# Altium footprint library SOT23-5.PcbLib: 1 footprints
Each footprint in its own frame and in the unit in brackets; x right, y up, seen from the top. Pads: shape width x height; smd on the part's side, far side on the other; paste and mask are expansions set on the pad; w line width, h text height; cw(c..) or ccw(c..) is an arc to the next point about the centre after c.
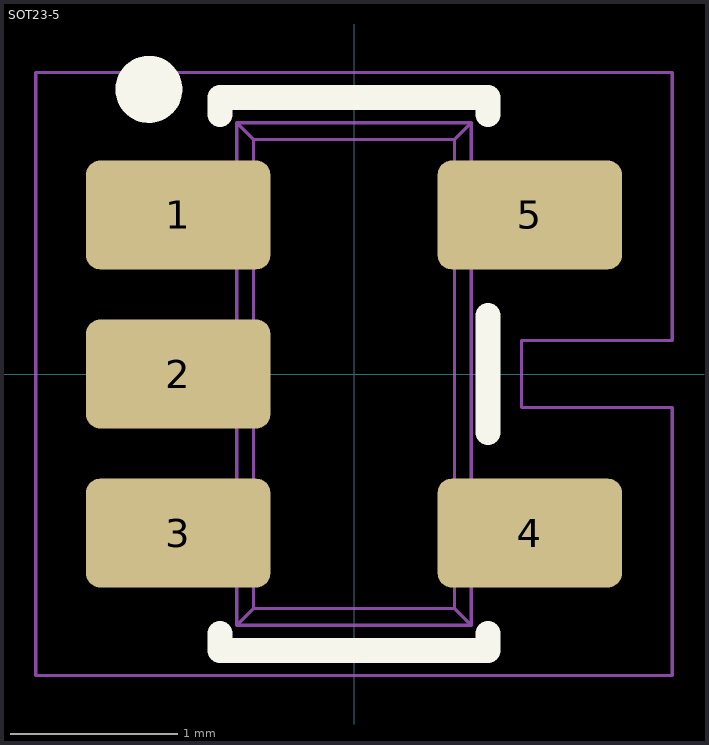
[diagram p0: the footprint, top view; thin cyan lines are the x and y axes]

## SOT23-5 [mm]
height 1.8
pads (5):
  rrect25% 1.1x0.65 smd paste+0 mask+0.075: 1(-1.05,0.95) 2(-1.05,0) 3(-1.05,-0.95) 4(1.05,-0.95) 5(1.05,0.95)
Top Overlay:
  circle w0.25: c-1.225,1.7 r0.075
  lines w0.15: -0.8,-1.55 -0.8,-1.65 0.8,-1.65 0.8,-1.55 ; -0.8,1.55 -0.8,1.65 0.8,1.65 0.8,1.55 ; 0.8,-0.35 0.8,0.35
Mechanical 9:
  text "'.PN'" at 0.292,-0.916 h0.5
Mechanical 15:
  lines w0.02: -1.9,-1.8 -1.9,1.8 1.9,1.8 1.9,0.2 1,0.2 1,-0.2 1.9,-0.2 1.9,-1.8 -1.9,-1.8
Mechanical 17:
  lines w0.02: -0.9,-1.15 -0.9,-0.75 ; -0.9,-0.2 -0.9,0.2 ; -0.9,0.75 -0.9,1.15 ; -0.7,-1.15 -1.3,-1.15 -1.3,-0.75 -0.7,-0.75 ; -0.7,-0.2 -1.3,-0.2 -1.3,0.2 -0.7,0.2 ; -0.7,0.75 -1.3,0.75 -1.3,1.15 -0.7,1.15 ; 0.7,-1.15 1.3,-1.15 1.3,-0.75 0.7,-0.75 ; 0.7,0.75 1.3,0.75 1.3,1.15 0.7,1.15 ; 0.9,-1.15 0.9,-0.75 ; 0.9,0.75 0.9,1.15 ; -0.7,-1.5 -0.6,-1.4 ; -0.7,-1.5 -0.7,1.5 ; -0.7,-1.5 0.7,-1.5 ; -0.7,1.5 -0.6,1.4 ; -0.7,1.5 0.7,1.5 ; -0.6,-1.4 -0.6,1.4 ; -0.6,-1.4 0.6,-1.4 ; -0.6,1.4 0.6,1.4 ; 0.6,-1.4 0.6,1.4 ; 0.6,-1.4 0.6,-1.4 ; 0.6,-1.4 0.7,-1.5 ; 0.6,1.4 0.7,1.5 ; 0.7,-1.5 0.7,1.5
3D body: height 1.21, standoff 1.2, extent -0.5,1 -0.3,1.2
3D body "TPS3828-33QDBVRQ1.stp": height 1.2, standoff 0, extent -1.4,-1.45 1.4,1.45
3D body: height 0.01, standoff 0, extent -1.6,0.625 -0.5,1.275
3D body: height 0.01, standoff 0, extent -1.6,-0.325 -0.5,0.325
3D body: height 0.01, standoff 0, extent -1.6,-1.275 -0.5,-0.625
3D body: height 0.01, standoff 0, extent 0.5,-1.275 1.6,-0.625
3D body: height 0.01, standoff 0, extent 0.5,0.625 1.6,1.275